# Altium footprint library SAMTEC SMD.PcbLib: 165 footprints (part 9 of 17)
Each footprint in its own frame and in the unit in brackets; x right, y up, seen from the top. Pads: shape width x height; smd on the part's side, far side on the other; paste and mask are expansions set on the pad; w line width, h text height; cw(c..) or ccw(c..) is an arc to the next point about the centre after c.
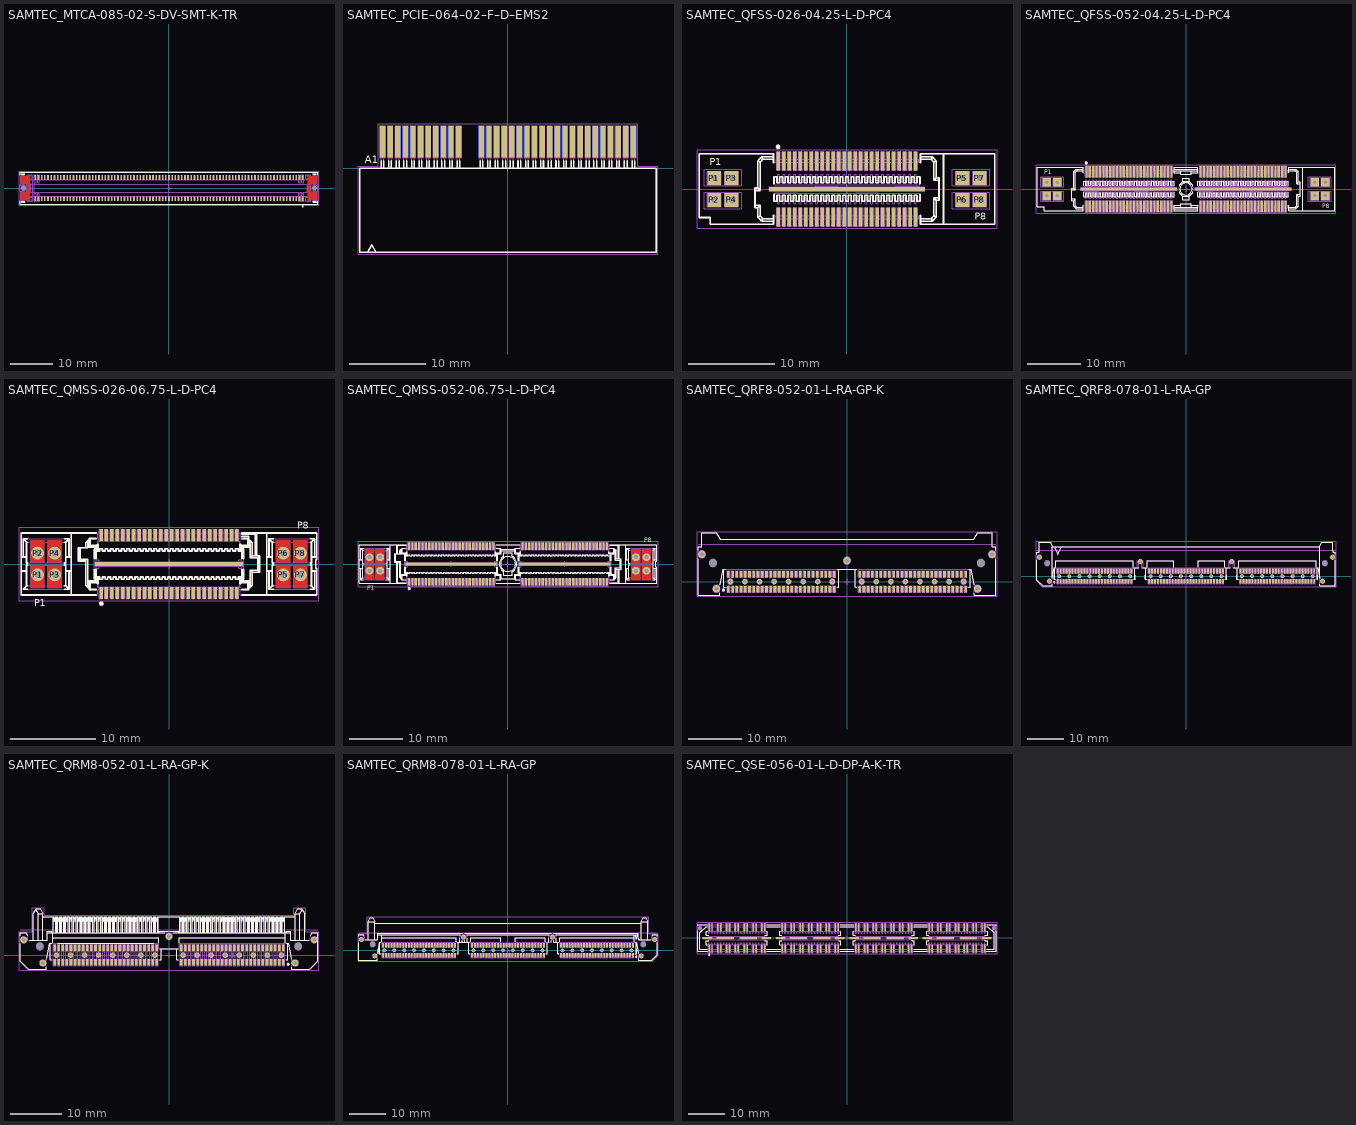
[diagram p8: the footprints below, top view; thin cyan lines are the x and y axes]

## SAMTEC_MTCA-085-02-S-DV-SMT-K-TR [mm] "170 Contacts, Pitch 0.75mm, Micro TCA Connector"
height 12.85
pads (172):
  rect 0.4x1.15 smd: 1(31.5,-2.5) 2(30.75,-2.5) 3(30,-2.5) 4(29.25,-2.5) 5(28.5,-2.5) 6(27.75,-2.5) 7(27,-2.5) 8(26.25,-2.5) 9(25.5,-2.5) 10(24.75,-2.5) 11(24,-2.5) 12(23.25,-2.5) 13(22.5,-2.5) 14(21.75,-2.5) 15(21,-2.5) 16(20.25,-2.5) 17(19.5,-2.5) 18(18.75,-2.5) 19(18,-2.5) 20(17.25,-2.5) 21(16.5,-2.5) 22(15.75,-2.5) 23(15,-2.5) 24(14.25,-2.5) 25(13.5,-2.5) 26(12.75,-2.5) 27(12,-2.5) 28(11.25,-2.5) 29(10.5,-2.5) 30(9.75,-2.5) 31(9,-2.5) 32(8.25,-2.5) 33(7.5,-2.5) 34(6.75,-2.5) 35(6,-2.5) 36(5.25,-2.5) 37(4.5,-2.5) 38(3.75,-2.5) 39(3,-2.5) 40(2.25,-2.5) 41(1.5,-2.5) 42(0.75,-2.5) 43(0,-2.5) 44(-0.75,-2.5) 45(-1.5,-2.5) 46(-2.25,-2.5) 47(-3,-2.5) 48(-3.75,-2.5) 49(-4.5,-2.5) 50(-5.25,-2.5) 51(-6,-2.5) 52(-6.75,-2.5) 53(-7.5,-2.5) 54(-8.25,-2.5) 55(-9,-2.5) 56(-9.75,-2.5) 57(-10.5,-2.5) 58(-11.25,-2.5) 59(-12,-2.5) 60(-12.75,-2.5) 61(-13.5,-2.5) 62(-14.25,-2.5) 63(-15,-2.5) 64(-15.75,-2.5) 65(-16.5,-2.5) 66(-17.25,-2.5) 67(-18,-2.5) 68(-18.75,-2.5) 69(-19.5,-2.5) 70(-20.25,-2.5) 71(-21,-2.5) 72(-21.75,-2.5) 73(-22.5,-2.5) 74(-23.25,-2.5) 75(-24,-2.5) 76(-24.75,-2.5) 77(-25.5,-2.5) 78(-26.25,-2.5) 79(-27,-2.5) 80(-27.75,-2.5) 81(-28.5,-2.5) 82(-29.25,-2.5) 83(-30,-2.5) 84(-30.75,-2.5) 85(-31.5,-2.5) 86(-31.5,2.5) 87(-30.75,2.5) 88(-30,2.5) 89(-29.25,2.5) 90(-28.5,2.5) 91(-27.75,2.5) 92(-27,2.5) 93(-26.25,2.5) 94(-25.5,2.5) 95(-24.75,2.5) 96(-24,2.5) 97(-23.25,2.5) 98(-22.5,2.5) 99(-21.75,2.5) 100(-21,2.5) 101(-20.25,2.5) 102(-19.5,2.5) 103(-18.75,2.5) 104(-18,2.5) 105(-17.25,2.5) 106(-16.5,2.5) 107(-15.75,2.5) 108(-15,2.5) 109(-14.25,2.5) 110(-13.5,2.5) 111(-12.75,2.5) 112(-12,2.5) 113(-11.25,2.5) 114(-10.5,2.5) 115(-9.75,2.5) 116(-9,2.5) 117(-8.25,2.5) 118(-7.5,2.5) 119(-6.75,2.5) 120(-6,2.5) 121(-5.25,2.5) 122(-4.5,2.5) 123(-3.75,2.5) 124(-3,2.5) 125(-2.25,2.5) 126(-1.5,2.5) 127(-0.75,2.5) 128(0,2.5) 129(0.75,2.5) 130(1.5,2.5) 131(2.25,2.5) 132(3,2.5) 133(3.75,2.5) 134(4.5,2.5) 135(5.25,2.5) 136(6,2.5) 137(6.75,2.5) 138(7.5,2.5) 139(8.25,2.5) 140(9,2.5) 141(9.75,2.5) 142(10.5,2.5) 143(11.25,2.5) 144(12,2.5) 145(12.75,2.5) 146(13.5,2.5) 147(14.25,2.5) 148(15,2.5) 149(15.75,2.5) 150(16.5,2.5) 151(17.25,2.5) 152(18,2.5) 153(18.75,2.5) 154(19.5,2.5) 155(20.25,2.5) 156(21,2.5) 157(21.75,2.5) 158(22.5,2.5) 159(23.25,2.5) 160(24,2.5) 161(24.75,2.5) 162(25.5,2.5) 163(26.25,2.5) 164(27,2.5) 165(27.75,2.5) 166(28.5,2.5) 167(29.25,2.5) 168(30,2.5) 169(30.75,2.5) 170(31.5,2.5)
  round 0.5 hole 1.2 unplated mask+0.35: 171(-34.25,0) 172(34.25,0)
Top Layer:
  region: 34.9,2.75 34.9,1.1 34.25,1.1 34.106,1.091 33.829,1.016 33.58,0.873 33.377,0.67 33.234,0.421 33.159,0.144 33.159,-0.144 33.234,-0.421 33.377,-0.67 33.58,-0.873 33.829,-1.016 34.106,-1.091 34.25,-1.1 34.9,-1.1 34.9,-2.75 32.85,-2.75 32.85,2.75
  region: -34.9,-2.75 -34.9,-1.1 -34.25,-1.1 -34.106,-1.091 -33.829,-1.016 -33.58,-0.873 -33.377,-0.67 -33.234,-0.421 -33.159,-0.144 -33.159,0.144 -33.234,0.421 -33.377,0.67 -33.58,0.873 -33.829,1.016 -34.106,1.091 -34.25,1.1 -34.9,1.1 -34.9,2.75 -32.85,2.75 -32.85,-2.75
Top Overlay:
  circle w0.25: c31.525,-4.3 r0.125
  lines w0.2: -35,-3.15 -35,-3.75 35,-3.75 35,-3.15 ; -35,3.15 -35,3.75 35,3.75 35,3.15 ; -34.75,-3.15 -34.75,-3.35 ; -34.75,3.15 -34.75,3.35 ; -34.55,3.15 -34.75,3.35 ; -34.2,3.15 -34,3.35 ; -34,-3.15 -34,-3.35 ; -34,3.15 -34,3.35 ; 34,-3.15 34,-3.35 ; 34,3.15 34,3.35 ; 34.2,3.15 34,3.35 ; 34.55,3.15 34.75,3.35 ; 34.75,-3.15 34.75,-3.35 ; 34.75,3.15 34.75,3.35 ; -34.75,-3.35 -34,-3.35 ; -34.75,-3.35 -34.55,-3.15 -34.2,-3.15 -34,-3.35 ; -34.75,3.35 -34,3.35 ; 34,-3.35 34.75,-3.35 ; 34,-3.35 34.2,-3.15 34.55,-3.15 34.75,-3.35 ; 34,3.35 34.75,3.35
Mechanical 8:
  circle w0.1: c-34.25,0 r0.6
  lines w0.1: -34.75,0 -34.25,0 ; -34.25,-0.5 -34.25,0 ; -34.25,0.5 -34.25,0 ; -33.75,0 -34.25,0 ; -32.1,-3.075 -32.1,3.075 ; -0.5,0 0,0 ; 0,-0.5 0,0 ; 0,0.5 0,0 ; 0.5,0 0,0 ; 33.75,0 34.25,0 ; 34.25,-0.5 34.25,0 ; 34.25,0.5 34.25,0 ; 34.75,0 34.25,0 ; -31.7,-3.075 -31.7,3.075 ; -31.7,-3.075 -31.3,-3.075 ; -31.7,-3.075 -31.7,-1.925 -31.3,-1.925 -31.3,-3.075 ; -31.7,-3.075 -31.5,-2.5 -31.3,-3.075 ; -31.7,3.075 -31.3,3.075 ; -31.7,3.075 -31.7,1.925 -31.3,1.925 -31.3,3.075 ; -31.7,3.075 -31.5,2.5 -31.3,3.075 ; -30.95,-3.075 -30.55,-3.075 ; -30.95,-3.075 -30.95,-1.925 -30.55,-1.925 -30.55,-3.075 ; -30.95,-3.075 -30.75,-2.5 -30.55,-3.075 ; -30.95,3.075 -30.55,3.075 ; -30.95,3.075 -30.95,1.925 -30.55,1.925 -30.55,3.075 ; -30.95,3.075 -30.75,2.5 -30.55,3.075 ; 30.55,-3.075 30.55,-1.925 30.95,-1.925 30.95,-3.075 ; 30.55,-3.075 30.95,-3.075 ; 30.55,-3.075 30.75,-2.5 30.95,-3.075 ; 30.55,3.075 30.55,1.925 30.95,1.925 30.95,3.075 ; 30.55,3.075 30.95,3.075 ; 30.55,3.075 30.75,2.5 30.95,3.075 ; 31.3,-3.075 31.3,-1.925 31.7,-1.925 31.7,-3.075 ; 31.3,-3.075 31.7,-3.075 ; 31.3,-3.075 31.5,-2.5 31.7,-3.075 ; 31.3,3.075 31.3,1.925 31.7,1.925 31.7,3.075 ; 31.3,3.075 31.7,3.075 ; 31.3,3.075 31.5,2.5 31.7,3.075 ; -34.9,-2.75 -34.9,-1.1 -34.25,-1.1 ccw(c-34.25,0) -34.25,1.1 -34.9,1.1 -34.9,2.75 -32.85,2.75 -32.85,-2.75 -34.9,-2.75 ; 32.85,-2.75 34.9,-2.75 34.9,-1.1 34.25,-1.1 cw(c34.25,0) 34.25,1.1 34.9,1.1 34.9,2.75 32.85,2.75 32.85,-2.75
Mechanical 14:
  lines w0.1: -35,-0.7 -34.525,-0.7 ; -35,0.7 -34.525,0.7 ; -34.525,-3.15 -34.525,3.15 ; -34.525,-1 -34.8,-1 -35,-0.8 -35,0.8 -34.8,1 -34.525,1 ; -34.225,-3.15 -34.225,3.15 ; -33.35,-2.95 -32.205,-2.95 ; -33.35,2.95 -32.205,2.95 ; -31.705,-1.95 -33.575,-1.95 ; -31.705,1.25 -31.705,3.15 -31.295,3.15 -31.295,1.25 ; -31.7,1.25 -31.29,1.25 ; -31.7,1.95 -33.575,1.95 ; -31.295,-1.95 -30.955,-1.95 ; -31.295,1.95 -30.955,1.95 ; -30.545,-1.95 30.545,-1.95 ; -30.545,1.95 30.55,1.95 ; 30.955,-1.95 31.295,-1.95 ; 30.955,1.95 31.295,1.95 ; 31.705,-1.95 33.575,-1.95 ; 31.705,1.95 33.575,1.95 ; 32.205,-2.95 33.35,-2.95 ; 32.205,2.95 33.35,2.95 ; 34.225,-3.15 34.225,3.15 ; 34.525,-3.15 34.525,3.15 ; 34.525,-1 34.8,-1 35,-0.8 35,0.8 34.8,1 34.525,1 ; 34.525,-0.7 35,-0.7 ; 34.525,0.7 35,0.7 ; -35,-2.9 -34.8,-2.7 -34.55,-2.7 ; -35,-2.9 -35,-3.75 35,-3.75 35,-2.9 ; -35,-2.9 -34.75,-2.9 ; -35,2.9 -35,3.75 35,3.75 35,2.9 ; -35,2.9 -34.8,2.7 -34.55,2.7 ; -35,2.9 -34.75,2.9 ; -34.75,-3.35 -34.75,-2.9 ; -34.75,-3.35 -34,-3.35 ; -34.75,-3.35 -34.55,-3.15 ; -34.75,-2.9 -34.55,-2.7 ; -34.75,2.9 -34.75,3.35 ; -34.75,2.9 -34.55,2.7 ; -34.75,3.35 -34,3.35 ; -34.75,3.35 -34.55,3.15 ; -34.55,-3.15 -34.2,-3.15 ; -34.55,-3.15 -34.55,-2.7 ; -34.55,2.7 -34.55,3.15 ; -34.55,3.15 -34.2,3.15 ; -34.2,-3.15 -34.2,3.15 ; -34.2,-3.15 -34,-3.35 ; -34.2,3.15 -34,3.35 ; -34,-3.35 -34,3.35 ; -33.575,-1.95 -33.575,1.95 ; -33.575,-1.95 -32.575,-0.95 ; -33.575,1.95 -32.575,0.95 ; -32.575,-0.95 32.575,-0.95 ; -32.575,-0.95 -32.575,0.95 ; -32.575,0.95 32.575,0.95 ; 32.575,-0.95 32.575,0.95 ; 32.575,-0.95 33.575,-1.95 ; 32.575,0.95 33.575,1.95 ; 33.575,-1.95 33.575,1.95 ; 34,-3.35 34.75,-3.35 ; 34,-3.35 34.2,-3.15 ; 34,-3.35 34,3.35 ; 34,3.35 34.2,3.15 ; 34,3.35 34.75,3.35 ; 34.2,-3.15 34.2,3.15 ; 34.2,-3.15 34.55,-3.15 ; 34.2,3.15 34.55,3.15 ; 34.55,-3.15 34.55,-2.7 ; 34.55,-3.15 34.75,-3.35 ; 34.55,-2.7 34.8,-2.7 35,-2.9 ; 34.55,-2.7 34.75,-2.9 ; 34.55,2.7 34.8,2.7 35,2.9 ; 34.55,2.7 34.55,3.15 ; 34.55,2.7 34.75,2.9 ; 34.55,3.15 34.75,3.35 ; 34.75,-3.35 34.75,-2.9 ; 34.75,-2.9 35,-2.9 ; 34.75,2.9 34.75,3.35 ; 34.75,2.9 35,2.9 ; -33.35,-3.15 -33.35,-2.15 -32.205,-2.15 -32.205,-3.15 -33.35,-3.15 ; -33.35,2.15 -32.205,2.15 -32.205,3.15 -33.35,3.15 -33.35,2.15 ; -31.705,-3.15 -31.295,-3.15 -31.295,-1.25 -31.705,-1.25 -31.705,-3.15 ; -30.955,-3.15 -30.955,-1.25 -30.545,-1.25 -30.545,-3.15 -30.955,-3.15 ; -30.955,1.25 -30.545,1.25 -30.545,3.15 -30.955,3.15 -30.955,1.25 ; 30.545,-3.15 30.955,-3.15 30.955,-1.25 30.545,-1.25 30.545,-3.15 ; 30.545,1.25 30.545,3.15 30.955,3.15 30.955,1.25 30.545,1.25 ; 31.295,-3.15 31.295,-1.25 31.705,-1.25 31.705,-3.15 31.295,-3.15 ; 31.295,1.25 31.705,1.25 31.705,3.15 31.295,3.15 31.295,1.25 ; 32.205,-3.15 32.205,-2.15 33.35,-2.15 33.35,-3.15 32.205,-3.15 ; 32.205,2.15 32.205,3.15 33.35,3.15 33.35,2.15 32.205,2.15
Mechanical 15:
  lines w0.05: -35.25,-4 -35.25,4 35.25,4 35.25,-4 -35.25,-4
3D body "SAMTEC_MTCA-085-02-S-DV-SMT-K-TR.stp": height 12.85, standoff -1.39, extent -35,-3.75 35,3.75

## SAMTEC_PCIE–064–02–F–D–EMS2 [mm] "64, Positions, Pitch 1,00 mm, PCI Express® Edge Mount Socket, PCIE Serie"
height 8.7
pads (64):
  rect 0.7x4.2 smd: A1(-16.497,3.501) A2(-15.497,3.501) A3(-14.497,3.501) A4(-13.497,3.501) A5(-12.497,3.501) A6(-11.497,3.501) A7(-10.497,3.501) A8(-9.497,3.501) A9(-8.497,3.501) A10(-7.497,3.501) A11(-6.497,3.501) A12(-3.497,3.501) A13(-2.497,3.501) A14(-1.497,3.501) A15(-0.497,3.501) A16(0.503,3.501) A17(1.503,3.501) A18(2.503,3.501) A19(3.503,3.501) A20(4.503,3.501) A21(5.503,3.501) A22(6.503,3.501) A23(7.503,3.501) A24(8.503,3.501) A25(9.503,3.501) A26(10.503,3.501) A27(11.503,3.501) A28(12.503,3.501) A29(13.503,3.501) A30(14.503,3.501) A31(15.503,3.501) A32(16.503,3.501)
  rect 0.7x4.2 smd far side: B1(-16.497,3.501) B2(-15.497,3.501) B3(-14.497,3.501) B4(-13.497,3.501) B5(-12.497,3.501) B6(-11.497,3.501) B7(-10.497,3.501) B8(-9.497,3.501) B9(-8.497,3.501) B10(-7.497,3.501) B11(-6.497,3.501) B12(-3.497,3.501) B13(-2.497,3.501) B14(-1.497,3.501) B15(-0.497,3.501) B16(0.503,3.501) B17(1.503,3.501) B18(2.503,3.501) B19(3.503,3.501) B20(4.503,3.501) B21(5.503,3.501) B22(6.503,3.501) B23(7.503,3.501) B24(8.503,3.501) B25(9.503,3.501) B26(10.503,3.501) B27(11.503,3.501) B28(12.503,3.501) B29(13.503,3.501) B30(14.503,3.501) B31(15.503,3.501) B32(16.503,3.501)
Top Overlay:
  lines w0.2: -18.476,-11.049 -17.926,-10.074 -17.376,-11.049 ; -16.69,0 -16.69,1.001 ; -16.335,0 -16.335,1.001 ; -15.69,0 -15.69,1.001 ; -15.335,0 -15.335,1.001 ; -14.69,0 -14.69,1.001 ; -14.335,0 -14.335,1.001 ; -13.69,0 -13.69,1.001 ; -13.335,0 -13.335,1.001 ; -12.69,0 -12.69,1.001 ; -12.335,0 -12.335,1.001 ; -11.69,0 -11.69,1.001 ; -11.335,0 -11.335,1.001 ; -10.69,0 -10.69,1.001 ; -10.335,0 -10.335,1.001 ; -9.69,0 -9.69,1.001 ; -9.335,0 -9.335,1.001 ; -8.69,0 -8.69,1.001 ; -8.335,0 -8.335,1.001 ; -7.69,0 -7.69,1.001 ; -7.335,0 -7.335,1.001 ; -6.683,0 -6.683,1.001 ; -6.327,0 -6.327,1.001 ; -3.68,0 -3.68,1.001 ; -3.325,0 -3.325,1.001 ; -2.68,0 -2.68,1.001 ; -2.325,0 -2.325,1.001 ; -1.68,0 -1.68,1.001 ; -1.325,0 -1.325,1.001 ; -0.68,0 -0.68,1.001 ; -0.325,0 -0.325,1.001 ; 0.32,0 0.32,1.001 ; 0.675,0 0.675,1.001 ; 1.32,0 1.32,1.001 ; 1.675,0 1.675,1.001 ; 2.32,0 2.32,1.001 ; 2.675,0 2.675,1.001 ; 3.32,0 3.32,1.001 ; 3.675,0 3.675,1.001 ; 4.32,0 4.32,1.001 ; 4.675,0 4.675,1.001 ; 5.32,0 5.32,1.001 ; 5.675,0 5.675,1.001 ; 6.32,0 6.32,1.001 ; 6.675,0 6.675,1.001 ; 7.32,0 7.32,1.001 ; 7.675,0 7.675,1.001 ; 8.32,0 8.32,1.001 ; 8.675,0 8.675,1.001 ; 9.32,0 9.32,1.001 ; 9.675,0 9.675,1.001 ; 10.32,0 10.32,1.001 ; 10.675,0 10.675,1.001 ; 11.32,0 11.32,1.001 ; 11.675,0 11.675,1.001 ; 12.32,0 12.32,1.001 ; 12.675,0 12.675,1.001 ; 13.32,0 13.32,1.001 ; 13.675,0 13.675,1.001 ; 14.32,0 14.32,1.001 ; 14.675,0 14.675,1.001 ; 15.32,0 15.32,1.001 ; 15.675,0 15.675,1.001 ; 16.335,0 16.335,1.001 ; 16.69,0 16.69,1.001 ; -19.492,-11.049 -19.492,0 19.497,0 19.497,-11.049 -19.492,-11.049
  text "A1" at -18.85,0.65 h1
Bottom Overlay:
  lines w0.2: -19.492,-8.249 -13.27,-8.249 ; -19.492,-7.449 -13.27,-7.449 -13.27,-11.049 ; -16.69,0 -16.69,1.001 ; -16.335,0 -16.335,1.001 ; -15.69,0 -15.69,1.001 ; -15.335,0 -15.335,1.001 ; -14.69,0 -14.69,1.001 ; -14.335,0 -14.335,1.001 ; -13.69,0 -13.69,1.001 ; -13.335,0 -13.335,1.001 ; -12.69,0 -12.69,1.001 ; -12.335,0 -12.335,1.001 ; -11.87,-11.049 -11.87,-7.449 -4.888,-7.449 -4.888,-11.049 ; -11.87,-8.249 -4.888,-8.249 ; -11.69,0 -11.69,1.001 ; -11.335,0 -11.335,1.001 ; -10.69,0 -10.69,1.001 ; -10.335,0 -10.335,1.001 ; -9.69,0 -9.69,1.001 ; -9.335,0 -9.335,1.001 ; -8.69,0 -8.69,1.001 ; -8.335,0 -8.335,1.001 ; -7.69,0 -7.69,1.001 ; -7.335,0 -7.335,1.001 ; -6.683,0 -6.683,1.001 ; -6.327,0 -6.327,1.001 ; -3.68,0 -3.68,1.001 ; -3.488,-11.049 -3.488,-7.449 3.494,-7.449 3.494,-11.049 ; -3.488,-8.249 3.494,-8.249 ; -3.325,0 -3.325,1.001 ; -2.68,0 -2.68,1.001 ; -2.325,0 -2.325,1.001 ; -1.68,0 -1.68,1.001 ; -1.325,0 -1.325,1.001 ; -0.68,0 -0.68,1.001 ; -0.325,0 -0.325,1.001 ; 0.32,0 0.32,1.001 ; 0.675,0 0.675,1.001 ; 1.32,0 1.32,1.001 ; 1.675,0 1.675,1.001 ; 2.32,0 2.32,1.001 ; 2.675,0 2.675,1.001 ; 3.32,0 3.32,1.001 ; 3.675,0 3.675,1.001 ; 4.32,0 4.32,1.001 ; 4.675,0 4.675,1.001 ; 4.894,-11.049 4.894,-7.449 11.876,-7.449 11.876,-11.049 ; 4.894,-8.249 11.876,-8.249 ; 5.32,0 5.32,1.001 ; 5.675,0 5.675,1.001 ; 6.32,0 6.32,1.001 ; 6.675,0 6.675,1.001 ; 7.32,0 7.32,1.001 ; 7.675,0 7.675,1.001 ; 8.32,0 8.32,1.001 ; 8.675,0 8.675,1.001 ; 9.32,0 9.32,1.001 ; 9.675,0 9.675,1.001 ; 10.32,0 10.32,1.001 ; 10.675,0 10.675,1.001 ; 11.32,0 11.32,1.001 ; 11.675,0 11.675,1.001 ; 12.32,0 12.32,1.001 ; 12.675,0 12.675,1.001 ; 13.276,-11.049 13.276,-7.449 19.497,-7.449 ; 13.276,-8.249 19.497,-8.249 ; 13.32,0 13.32,1.001 ; 13.675,0 13.675,1.001 ; 14.32,0 14.32,1.001 ; 14.675,0 14.675,1.001 ; 15.32,0 15.32,1.001 ; 15.675,0 15.675,1.001 ; 16.335,0 16.335,1.001 ; 16.69,0 16.69,1.001 ; -19.492,-11.049 -19.492,0 19.497,0 19.497,-11.049 -19.492,-11.049
  text "B1" at -17.575,0.625 h1
Mechanical 8:
  drawing of 196 lines, arcs and shapes, not listed
Mechanical 14:
  lines w0.1: -18.476,-11.049 -17.926,-10.074 -17.376,-11.049 ; -16.69,0 -16.69,4.991 -16.335,4.991 -16.335,0 ; -15.69,0 -15.69,4.991 -15.335,4.991 -15.335,0 ; -14.69,0 -14.69,4.991 -14.335,4.991 -14.335,0 ; -13.69,0 -13.69,4.991 -13.335,4.991 -13.335,0 ; -12.69,0 -12.69,4.991 -12.335,4.991 -12.335,0 ; -11.69,0 -11.69,4.991 -11.335,4.991 -11.335,0 ; -10.69,0 -10.69,4.991 -10.335,4.991 -10.335,0 ; -9.69,0 -9.69,4.991 -9.335,4.991 -9.335,0 ; -8.69,0 -8.69,4.991 -8.335,4.991 -8.335,0 ; -7.69,0 -7.69,4.991 -7.335,4.991 -7.335,0 ; -6.683,0 -6.683,4.991 -6.327,4.991 -6.327,0 ; -3.68,0 -3.68,4.991 -3.325,4.991 -3.325,0 ; -2.68,0 -2.68,4.991 -2.325,4.991 -2.325,0 ; -1.68,0 -1.68,4.991 -1.325,4.991 -1.325,0 ; -0.68,0 -0.68,4.991 -0.325,4.991 -0.325,0 ; 0.32,0 0.32,4.991 0.675,4.991 0.675,0 ; 1.32,0 1.32,4.991 1.675,4.991 1.675,0 ; 2.32,0 2.32,4.991 2.675,4.991 2.675,0 ; 3.32,0 3.32,4.991 3.675,4.991 3.675,0 ; 4.32,0 4.32,4.991 4.675,4.991 4.675,0 ; 5.32,0 5.32,4.991 5.675,4.991 5.675,0 ; 6.32,0 6.32,4.991 6.675,4.991 6.675,0 ; 7.32,0 7.32,4.991 7.675,4.991 7.675,0 ; 8.32,0 8.32,4.991 8.675,4.991 8.675,0 ; 9.32,0 9.32,4.991 9.675,4.991 9.675,0 ; 10.32,0 10.32,4.991 10.675,4.991 10.675,0 ; 11.32,0 11.32,4.991 11.675,4.991 11.675,0 ; 12.32,0 12.32,4.991 12.675,4.991 12.675,0 ; 13.32,0 13.32,4.991 13.675,4.991 13.675,0 ; 14.32,0 14.32,4.991 14.675,4.991 14.675,0 ; 15.32,0 15.32,4.991 15.675,4.991 15.675,0 ; 16.335,0 16.335,4.991 16.69,4.991 16.69,0 ; -19.492,-11.049 -19.492,0 19.497,0 19.497,-11.049 -19.492,-11.049
Mechanical 15:
  lines w0.1: -19.742,-11.299 19.747,-11.299 19.747,0.25 17.103,0.25 17.103,5.851 -17.097,5.851 -17.097,0.25 -19.742,0.25 -19.742,-11.299
3D body "SAMTEC_PCIE-064-02-F-D-EMS2.stp": height 2.84, standoff -5.85, extent -19.492,-11.074 19.497,4.991

## SAMTEC_QFSS-026-04.25-L-D-PC4 [mm] "52 (2x26) Contacts, Pitch 0.635mm, Straight Double Row 0,635 mm, Q2 Shielded Ground Plane Combo Power Socket Strip"
height 7.54
pads (61):
  rect 0.41x2.16 smd mask+0: 1(-7.937,3.24) 2(-7.937,-3.24) 3(-7.302,3.24) 4(-7.302,-3.24) 5(-6.667,3.24) 6(-6.667,-3.24) 7(-6.032,3.24) 8(-6.032,-3.24) 9(-5.397,3.24) 10(-5.397,-3.24) 11(-4.762,3.24) 12(-4.762,-3.24) 13(-4.127,3.24) 14(-4.127,-3.24) 15(-3.492,3.24) 16(-3.492,-3.24) 17(-2.857,3.24) 18(-2.857,-3.24) 19(-2.222,3.24) 20(-2.222,-3.24) 21(-1.587,3.24) 22(-1.587,-3.24) 23(-0.952,3.24) 24(-0.952,-3.24) 25(-0.317,3.24) 26(-0.317,-3.24) 27(0.318,3.24) 28(0.318,-3.24) 29(0.953,3.24) 30(0.953,-3.24) 31(1.588,3.24) 32(1.588,-3.24) 33(2.223,3.24) 34(2.223,-3.24) 35(2.858,3.24) 36(2.858,-3.24) 37(3.493,3.24) 38(3.493,-3.24) 39(4.128,3.24) 40(4.128,-3.24) 41(4.763,3.24) 42(4.763,-3.24) 43(5.398,3.24) 44(5.398,-3.24) 45(6.033,3.24) 46(6.033,-3.24) 47(6.668,3.24) 48(6.668,-3.24) 49(7.303,3.24) 50(7.303,-3.24) 51(7.938,3.24) 52(7.938,-3.24)
  rect 18.03x0.51 smd mask+0: P0(0,0)
  rect 1.6x1.6 / inner round 1.4 / far side round 1.4 hole 0.65: P1(-15.355,1.27) P2(-15.355,-1.27) P3(-13.355,1.27) P4(-13.355,-1.27) P5(13.355,1.27) P6(13.355,-1.27) P7(15.355,1.27) P8(15.355,-1.27)
Top Overlay:
  drawing of 278 lines, arcs and shapes, not listed
  text "P1" at -15.857,2.725 h0.8
  text "P8" at 14.803,-3.575 h0.8
Top Paste:
  region: 16.155,-2.07 16.155,-0.47 14.555,-0.47 14.555,-2.07
  region: 14.155,-2.07 14.155,-0.47 12.555,-0.47 12.555,-2.07
  region: 16.155,0.47 16.155,2.07 14.555,2.07 14.555,0.47
  region: 14.155,0.47 14.155,2.07 12.555,2.07 12.555,0.47
  region: -12.555,-2.07 -12.555,-0.47 -14.155,-0.47 -14.155,-2.07
  region: -14.555,-2.07 -14.555,-0.47 -16.155,-0.47 -16.155,-2.07
  region: -12.555,0.47 -12.555,2.07 -14.155,2.07 -14.155,0.47
  region: -14.555,0.47 -14.555,2.07 -16.155,2.07 -16.155,0.47
Mechanical 8:
  drawing of 392 lines, arcs and shapes, not listed
Mechanical 14:
  drawing of 556 lines, arcs and shapes, not listed
  text "P1" at -15.857,2.725 h0.8
  text "P8" at 14.803,-3.575 h0.8
Mechanical 15:
  lines w0.05: -17.357,-4.57 17.357,-4.57 17.357,4.57 -17.357,4.57 -17.357,-4.57
3D body "SAMTEC_QFSS-026-04.25-L-D-PC4.stp": height 7.44, standoff -1.78, extent -17.107,-4.064 17.107,4.064

## SAMTEC_QFSS-052-04.25-L-D-PC4 [mm] "104 (4x26) Contacts, Pitch 0.635mm, Straight Double Row 0,635 mm, Q2 Shielded Ground Plane Combo Power Socket Strip"
height 7.54
pads (114):
  rect 0.41x2.16 smd mask+0: 1(-18.606,3.24) 2(-18.606,-3.24) 3(-17.971,3.24) 4(-17.971,-3.24) 5(-17.336,3.24) 6(-17.336,-3.24) 7(-16.701,3.24) 8(-16.701,-3.24) 9(-16.066,3.24) 10(-16.066,-3.24) 11(-15.431,3.24) 12(-15.431,-3.24) 13(-14.796,3.24) 14(-14.796,-3.24) 15(-14.161,3.24) 16(-14.161,-3.24) 17(-13.526,3.24) 18(-13.526,-3.24) 19(-12.891,3.24) 20(-12.891,-3.24) 21(-12.256,3.24) 22(-12.256,-3.24) 23(-11.621,3.24) 24(-11.621,-3.24) 25(-10.986,3.24) 26(-10.986,-3.24) 27(-10.351,3.24) 28(-10.351,-3.24) 29(-9.716,3.24) 30(-9.716,-3.24) 31(-9.081,3.24) 32(-9.081,-3.24) 33(-8.446,3.24) 34(-8.446,-3.24) 35(-7.811,3.24) 36(-7.811,-3.24) 37(-7.176,3.24) 38(-7.176,-3.24) 39(-6.541,3.24) 40(-6.541,-3.24) 41(-5.906,3.24) 42(-5.906,-3.24) 43(-5.271,3.24) 44(-5.271,-3.24) 45(-4.636,3.24) 46(-4.636,-3.24) 47(-4.001,3.24) 48(-4.001,-3.24) 49(-3.366,3.24) 50(-3.366,-3.24) 51(-2.731,3.24) 52(-2.731,-3.24) 53(2.731,3.24) 54(2.731,-3.24) 55(3.366,3.24) 56(3.366,-3.24) 57(4.001,3.24) 58(4.001,-3.24) 59(4.636,3.24) 60(4.636,-3.24) 61(5.271,3.24) 62(5.271,-3.24) 63(5.906,3.24) 64(5.906,-3.24) 65(6.541,3.24) 66(6.541,-3.24) 67(7.176,3.24) 68(7.176,-3.24) 69(7.811,3.24) 70(7.811,-3.24) 71(8.446,3.24) 72(8.446,-3.24) 73(9.081,3.24) 74(9.081,-3.24) 75(9.716,3.24) 76(9.716,-3.24) 77(10.351,3.24) 78(10.351,-3.24) 79(10.986,3.24) 80(10.986,-3.24) 81(11.621,3.24) 82(11.621,-3.24) 83(12.256,3.24) 84(12.256,-3.24) 85(12.891,3.24) 86(12.891,-3.24) 87(13.526,3.24) 88(13.526,-3.24) 89(14.161,3.24) 90(14.161,-3.24) 91(14.796,3.24) 92(14.796,-3.24) 93(15.431,3.24) 94(15.431,-3.24) 95(16.066,3.24) 96(16.066,-3.24) 97(16.701,3.24) 98(16.701,-3.24) 99(17.336,3.24) 100(17.336,-3.24) 101(17.971,3.24) 102(17.971,-3.24) 103(18.606,3.24) 104(18.606,-3.24)
  rect 1.6x1.6 / inner round 1.4 / far side round 1.4 hole 0.65: P1(-26.023,1.27) P2(-26.023,-1.27) P3(-24.023,1.27) P4(-24.023,-1.27) P5(24.023,1.27) P6(24.023,-1.27) P7(26.023,1.27) P8(26.023,-1.27)
  rect 18.03x0.51 smd mask+0: P01(-10.668,0) P02(10.668,0)
Top Overlay:
  drawing of 527 lines, arcs and shapes, not listed
  text "P8" at 25.471,-3.575 h0.8
  text "P1" at -26.525,2.725 h0.8
Top Paste:
  region: -23.223,-2.07 -23.223,-0.47 -24.823,-0.47 -24.823,-2.07
  region: -25.223,-2.07 -25.223,-0.47 -26.823,-0.47 -26.823,-2.07
  region: -23.223,0.47 -23.223,2.07 -24.823,2.07 -24.823,0.47
  region: -25.223,0.47 -25.223,2.07 -26.823,2.07 -26.823,0.47
  region: 26.823,-2.07 26.823,-0.47 25.223,-0.47 25.223,-2.07
  region: 24.823,-2.07 24.823,-0.47 23.223,-0.47 23.223,-2.07
  region: 26.823,0.47 26.823,2.07 25.223,2.07 25.223,0.47
  region: 24.823,0.47 24.823,2.07 23.223,2.07 23.223,0.47
Mechanical 8:
  drawing of 716 lines, arcs and shapes, not listed
Mechanical 14:
  drawing of 1034 lines, arcs and shapes, not listed
  text "P8" at 25.471,-3.575 h0.8
  text "P1" at -26.525,2.725 h0.8
Mechanical 15:
  lines w0.05: -28.025,-4.57 28.025,-4.57 28.025,4.57 -28.025,4.57 -28.025,-4.57
3D body "SAMTEC_QFSS-052-04.25-L-D-PC4.stp": height 8.84, standoff -1.78, extent -27.775,-4.064 27.775,4.064
